# Altium footprint library MyPcbLib.PcbLib: 278 footprints (part 16 of 18)
Each footprint in its own frame and in the unit in brackets; x right, y up, seen from the top. Pads: shape width x height; smd on the part's side, far side on the other; paste and mask are expansions set on the pad; w line width, h text height; cw(c..) or ccw(c..) is an arc to the next point about the centre after c.
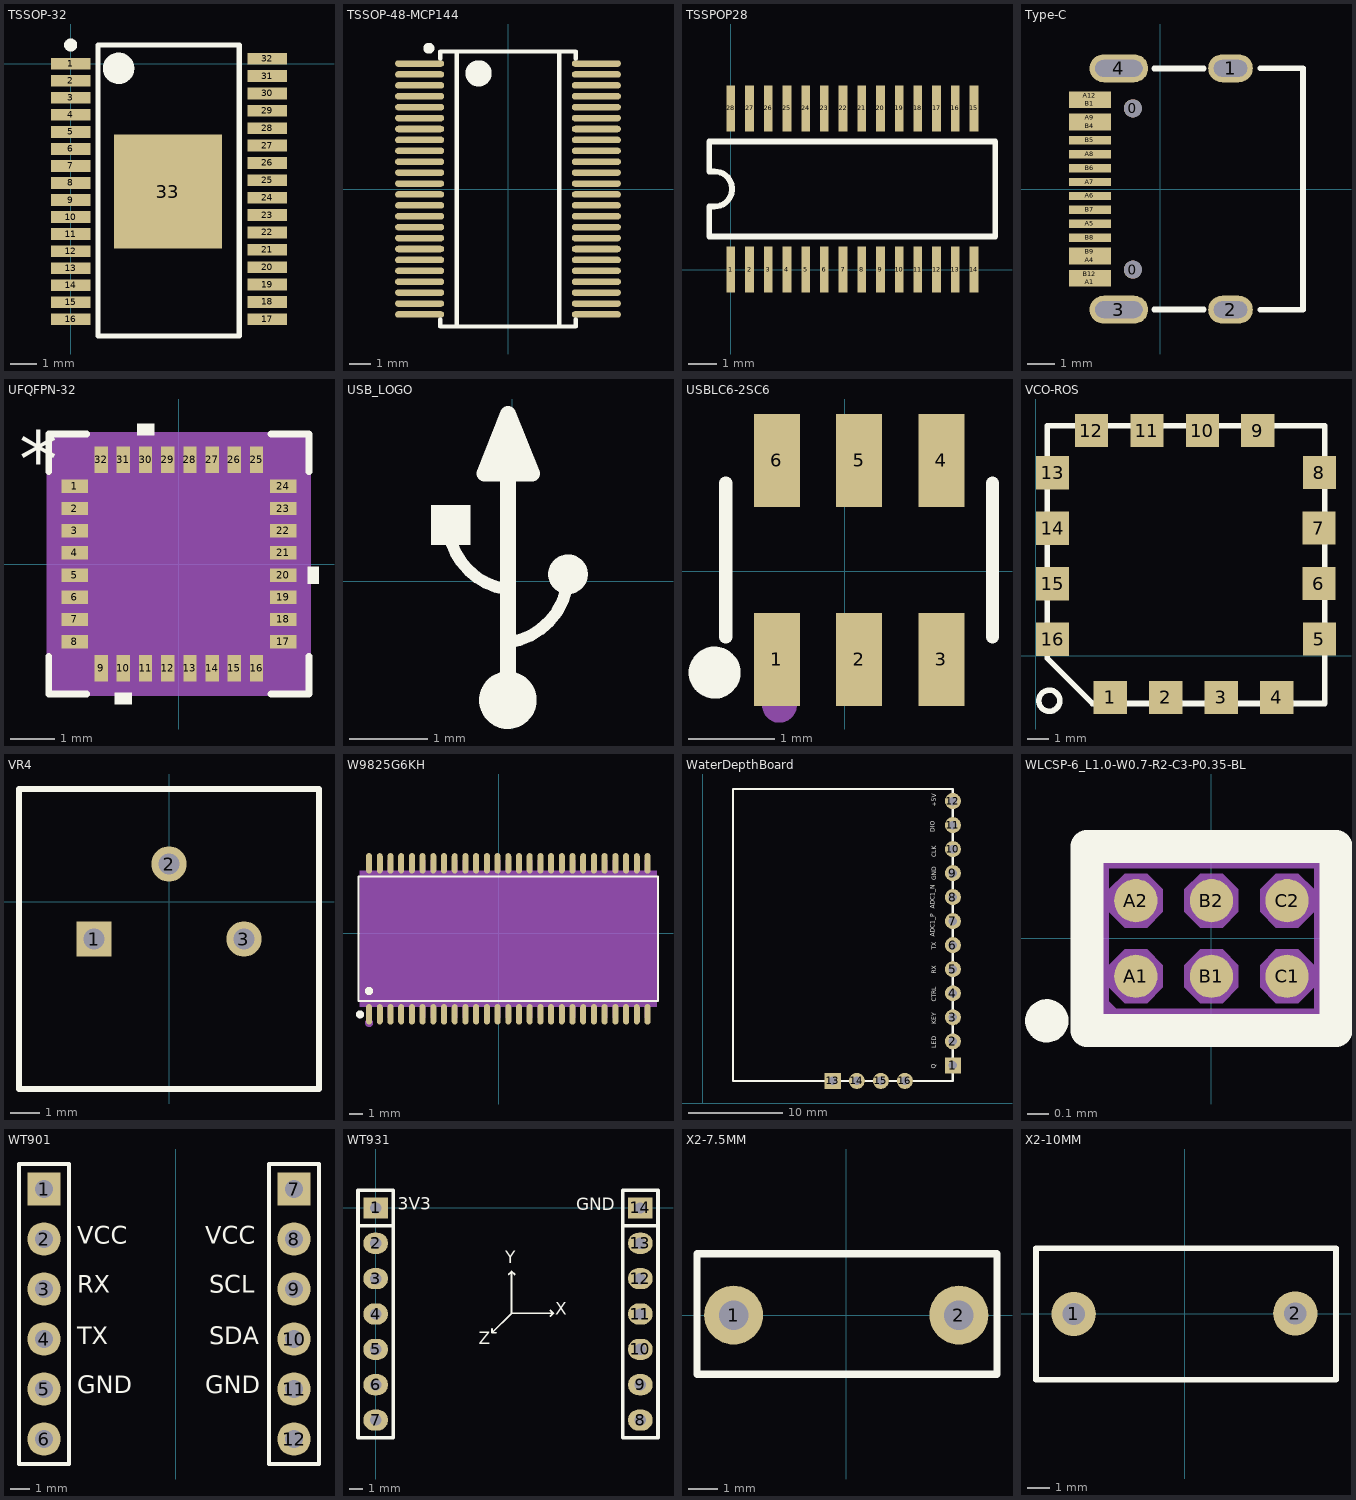
[diagram p15: the footprints below, top view; thin cyan lines are the x and y axes]

## TSSOP-32 [mm]
pads (33):
  rect 1.5x0.45 smd: 1(0,0) 2(0,-0.65) 3(0,-1.3) 4(0,-1.95) 5(0,-2.6) 6(0,-3.25) 7(0,-3.9) 8(0,-4.55) 9(0,-5.2) 10(0,-5.85) 11(0,-6.5) 12(0,-7.15) 13(0,-7.8) 14(0,-8.45) 15(0,-9.1) 16(0,-9.75) 17(7.5,-9.75) 18(7.5,-9.087) 19(7.5,-8.424) 20(7.5,-7.762) 21(7.5,-7.099) 22(7.5,-6.436) 23(7.5,-5.773) 24(7.5,-5.111) 25(7.5,-4.448) 26(7.5,-3.785) 27(7.5,-3.122) 28(7.5,-2.459) 29(7.5,-1.797) 30(7.5,-1.134) 31(7.5,-0.471) 32(7.5,0.192)
  rect 4.11x4.36 smd: 33(3.708,-4.877)
Top Overlay:
  circle w0.25: c0,0.711 r0.125
  circle w0.6: c1.829,-0.178 r0.3
  lines w0.2: 1.041,-10.389 6.426,-10.389 6.426,0.711 1.041,0.711 1.041,-10.389
3D body "User Library-TSSOP-32 11_1x6_2.STEP": height 1.1, standoff 0, extent -0.302,-10.351 7.798,0.749

## TSSOP-48-MCP144 [mm] "TSSOP, 48-Leads, Body 12.5x6.1mm, Pitch 0.5mm, IPC Medium Density"
height 1.2
pads (48):
  oval 2.25x0.3 smd: 1(-4.05,5.75) 2(-4.05,5.25) 3(-4.05,4.75) 4(-4.05,4.25) 5(-4.05,3.75) 6(-4.05,3.25) 7(-4.05,2.75) 8(-4.05,2.25) 9(-4.05,1.75) 10(-4.05,1.25) 11(-4.05,0.75) 12(-4.05,0.25) 13(-4.05,-0.25) 14(-4.05,-0.75) 15(-4.05,-1.25) 16(-4.05,-1.75) 17(-4.05,-2.25) 18(-4.05,-2.75) 19(-4.05,-3.25) 20(-4.05,-3.75) 21(-4.05,-4.25) 22(-4.05,-4.75) 23(-4.05,-5.25) 24(-4.05,-5.75) 25(4.05,-5.75) 26(4.05,-5.25) 27(4.05,-4.75) 28(4.05,-4.25) 29(4.05,-3.75) 30(4.05,-3.25) 31(4.05,-2.75) 32(4.05,-2.25) 33(4.05,-1.75) 34(4.05,-1.25) 35(4.05,-0.75) 36(4.05,-0.25) 37(4.05,0.25) 38(4.05,0.75) 39(4.05,1.25) 40(4.05,1.75) 41(4.05,2.25) 42(4.05,2.75) 43(4.05,3.25) 44(4.05,3.75) 45(4.05,4.25) 46(4.05,4.75) 47(4.05,5.25) 48(4.05,5.75)
Top Overlay:
  circle w0.25: c-3.625,6.45 r0.125
  circle w0.6: c-1.35,5.3 r0.3
  lines w0.2: -3.1,-5.969 -3.1,-6.3 3.1,-6.3 3.1,-5.969 ; -3.1,5.969 -3.1,6.3 3.1,6.3 3.1,5.969 ; -2.35,-6.3 -2.35,6.3 ; 2.35,-6.3 2.35,6.3
3D body "TSSOP-48-MCP144.STEP": height 1.2, standoff 0, extent -4.089,-6.299 4.099,6.301

## TSSPOP28 [mm]
pads (28):
  rect 0.3x1.6 smd: 1(0,0) 2(0.65,0) 3(1.299,0) 4(1.949,0) 5(2.599,0) 6(3.248,0) 7(3.898,0) 8(4.548,0) 9(5.197,0) 10(5.847,0) 11(6.497,0) 12(7.146,0) 13(7.796,0) 14(8.445,0) 15(8.445,5.6) 16(7.796,5.6) 17(7.146,5.6) 18(6.496,5.6) 19(5.847,5.6) 20(5.197,5.6) 21(4.548,5.6) 22(3.898,5.6) 23(3.248,5.6) 24(2.599,5.6) 25(1.949,5.6) 26(1.299,5.6) 27(0.65,5.6) 28(0,5.6)
Top Overlay:
  lines w0.2: -0.749,1.149 -0.749,2.191 -0.566,2.191 ccw(c-0.566,2.801) -0.566,3.41 -0.749,3.41 -0.749,4.451 9.182,4.451 9.182,1.149 -0.749,1.149
3D body "TSSOP28.STEP": height 1.05, standoff 0, extent -0.671,-0.601 9.129,5.999

## Type-C [mm]
pads (22):
  round 0.65 hole 0.65: 0(-0.98,-2.89) 0(-0.98,2.89)
  oval 1.6x1 hole 0.6 slot 1.2 at 0 deg: 1(2.52,4.325) 2(2.52,-4.325)
  oval 2.1x1 hole 0.6 slot 1.7 at 0 deg: 3(-1.48,-4.325) 4(-1.48,4.325)
  rect 1.5x0.3 smd: A1(-2.52,-3.35) A4(-2.52,-2.55) A5(-2.52,-1.25) A6(-2.52,-0.25) A7(-2.52,0.25) A8(-2.52,1.25) A9(-2.52,2.55) A12(-2.52,3.35) B1(-2.52,3.05) B4(-2.52,2.25) B5(-2.52,1.75) B6(-2.52,0.75) B7(-2.52,-0.75) B8(-2.52,-1.75) B9(-2.52,-2.25) B12(-2.52,-3.05)
Top Overlay:
  lines w0.203: -0.218,-4.318 1.56,-4.318 ; -0.218,4.318 1.56,4.318 ; 3.592,-4.325 5.12,-4.325 5.12,4.325 3.592,4.325
3D body "TypeC-SMD16P.STEP": height 3.36, standoff -0.9, extent -2.542,-4.458 5.209,4.492

## UFQFPN-32 [mm]
pads (32):
  rect 0.6x0.3 smd paste-0.15 mask+0: 1(-2.35,1.75) 2(-2.35,1.25) 3(-2.35,0.75) 4(-2.35,0.25) 5(-2.35,-0.25) 6(-2.35,-0.75) 7(-2.35,-1.25) 8(-2.35,-1.75) 17(2.35,-1.75) 18(2.35,-1.25) 19(2.35,-0.75) 20(2.35,-0.25) 21(2.35,0.25) 22(2.35,0.75) 23(2.35,1.25) 24(2.35,1.75)
  rect 0.3x0.6 smd paste-0.15 mask+0: 9(-1.75,-2.35) 10(-1.25,-2.35) 11(-0.75,-2.35) 12(-0.25,-2.35) 13(0.25,-2.35) 14(0.75,-2.35) 15(1.25,-2.35) 16(1.75,-2.35) 25(1.75,2.35) 26(1.25,2.35) 27(0.75,2.35) 28(0.25,2.35) 29(-0.25,2.35) 30(-0.75,2.35) 31(-1.25,2.35) 32(-1.75,2.35)
Top Overlay:
  region: -0.56,2.904 -0.941,2.904 -0.941,3.158 -0.56,3.158
  region: 2.904,-0.059 3.158,-0.059 3.158,-0.44 2.904,-0.44
  region: -1.06,-2.904 -1.441,-2.904 -1.441,-3.158 -1.06,-3.158
  lines w0.152: -2.931,-2.078 -2.931,-2.931 -2.078,-2.931 ; -2.931,2.078 -2.931,2.931 -2.078,2.931 ; 2.078,-2.931 2.931,-2.931 2.931,-2.078 ; 2.078,2.931 2.931,2.931 2.931,2.078
  text "*" at -3.602,1.746 h1.27
Top Paste:
  region: -1.6,2.65 -1.9,2.65 -1.9,2.05 -1.6,2.05
  region: -1.1,2.65 -1.4,2.65 -1.4,2.05 -1.1,2.05
  region: -0.6,2.65 -0.9,2.65 -0.9,2.05 -0.6,2.05
  region: -0.1,2.65 -0.4,2.65 -0.4,2.05 -0.1,2.05
  region: 0.4,2.65 0.1,2.65 0.1,2.05 0.4,2.05
  region: 0.9,2.65 0.6,2.65 0.6,2.05 0.9,2.05
  region: 1.4,2.65 1.1,2.65 1.1,2.05 1.4,2.05
  region: 1.9,2.65 1.6,2.65 1.6,2.05 1.9,2.05
  region: 2.65,1.9 2.05,1.9 2.05,1.6 2.65,1.6
  region: 2.65,1.4 2.05,1.4 2.05,1.1 2.65,1.1
  region: 2.65,0.9 2.05,0.9 2.05,0.6 2.65,0.6
  region: 2.65,0.4 2.05,0.4 2.05,0.1 2.65,0.1
  region: 2.65,-0.1 2.05,-0.1 2.05,-0.4 2.65,-0.4
  region: 2.65,-0.6 2.05,-0.6 2.05,-0.9 2.65,-0.9
  region: 2.65,-1.1 2.05,-1.1 2.05,-1.4 2.65,-1.4
  region: 2.65,-1.6 2.05,-1.6 2.05,-1.9 2.65,-1.9
  region: 1.9,-2.05 1.6,-2.05 1.6,-2.65 1.9,-2.65
  region: 1.4,-2.05 1.1,-2.05 1.1,-2.65 1.4,-2.65
  region: 0.9,-2.05 0.6,-2.05 0.6,-2.65 0.9,-2.65
  region: 0.4,-2.05 0.1,-2.05 0.1,-2.65 0.4,-2.65
  region: -0.1,-2.05 -0.4,-2.05 -0.4,-2.65 -0.1,-2.65
  region: -0.6,-2.05 -0.9,-2.05 -0.9,-2.65 -0.6,-2.65
  region: -1.1,-2.05 -1.4,-2.05 -1.4,-2.65 -1.1,-2.65
  region: -1.6,-2.05 -1.9,-2.05 -1.9,-2.65 -1.6,-2.65
  region: -2.05,-1.6 -2.65,-1.6 -2.65,-1.9 -2.05,-1.9
  region: -2.05,-1.1 -2.65,-1.1 -2.65,-1.4 -2.05,-1.4
  region: -2.05,-0.6 -2.65,-0.6 -2.65,-0.9 -2.05,-0.9
  region: -2.05,-0.1 -2.65,-0.1 -2.65,-0.4 -2.05,-0.4
  region: -2.05,0.4 -2.65,0.4 -2.65,0.1 -2.05,0.1
  region: -2.05,0.9 -2.65,0.9 -2.65,0.6 -2.05,0.6
  region: -2.05,1.4 -2.65,1.4 -2.65,1.1 -2.05,1.1
  region: -2.05,1.9 -2.65,1.9 -2.65,1.6 -2.05,1.6
Top Solder:
  region: -1.6,2.65 -1.9,2.65 -1.9,2.05 -1.6,2.05
  region: -1.1,2.65 -1.4,2.65 -1.4,2.05 -1.1,2.05
  region: -0.6,2.65 -0.9,2.65 -0.9,2.05 -0.6,2.05
  region: -0.1,2.65 -0.4,2.65 -0.4,2.05 -0.1,2.05
  region: 0.4,2.65 0.1,2.65 0.1,2.05 0.4,2.05
  region: 0.9,2.65 0.6,2.65 0.6,2.05 0.9,2.05
  region: 1.4,2.65 1.1,2.65 1.1,2.05 1.4,2.05
  region: 1.9,2.65 1.6,2.65 1.6,2.05 1.9,2.05
  region: 2.65,1.9 2.05,1.9 2.05,1.6 2.65,1.6
  region: 2.65,1.4 2.05,1.4 2.05,1.1 2.65,1.1
  region: 2.65,0.9 2.05,0.9 2.05,0.6 2.65,0.6
  region: 2.65,0.4 2.05,0.4 2.05,0.1 2.65,0.1
  region: 2.65,-0.1 2.05,-0.1 2.05,-0.4 2.65,-0.4
  region: 2.65,-0.6 2.05,-0.6 2.05,-0.9 2.65,-0.9
  region: 2.65,-1.1 2.05,-1.1 2.05,-1.4 2.65,-1.4
  region: 2.65,-1.6 2.05,-1.6 2.05,-1.9 2.65,-1.9
  region: 1.9,-2.05 1.6,-2.05 1.6,-2.65 1.9,-2.65
  region: 1.4,-2.05 1.1,-2.05 1.1,-2.65 1.4,-2.65
  region: 0.9,-2.05 0.6,-2.05 0.6,-2.65 0.9,-2.65
  region: 0.4,-2.05 0.1,-2.05 0.1,-2.65 0.4,-2.65
  region: -0.1,-2.05 -0.4,-2.05 -0.4,-2.65 -0.1,-2.65
  region: -0.6,-2.05 -0.9,-2.05 -0.9,-2.65 -0.6,-2.65
  region: -1.1,-2.05 -1.4,-2.05 -1.4,-2.65 -1.1,-2.65
  region: -1.6,-2.05 -1.9,-2.05 -1.9,-2.65 -1.6,-2.65
  region: -2.05,-1.6 -2.65,-1.6 -2.65,-1.9 -2.05,-1.9
  region: -2.05,-1.1 -2.65,-1.1 -2.65,-1.4 -2.05,-1.4
  region: -2.05,-0.6 -2.65,-0.6 -2.65,-0.9 -2.05,-0.9
  region: -2.05,-0.1 -2.65,-0.1 -2.65,-0.4 -2.05,-0.4
  region: -2.05,0.4 -2.65,0.4 -2.65,0.1 -2.05,0.1
  region: -2.05,0.9 -2.65,0.9 -2.65,0.6 -2.05,0.6
  region: -2.05,1.4 -2.65,1.4 -2.65,1.1 -2.05,1.1
  region: -2.05,1.9 -2.65,1.9 -2.65,1.6 -2.05,1.6
Mechanical 13:
  lines w0.025: -2.55,1.28 -1.28,2.55 ; -2.55,-2.55 -2.55,2.55 2.55,2.55 2.55,-2.55 -2.55,-2.55
  text "*" at -2.114,1.365 h1.27
Mechanical 15:
  region: -2.154,-2.804 -2.804,-2.804 -2.804,-2.154 -2.904,-2.154 -2.904,2.154 -2.804,2.154 -2.804,2.804 -2.154,2.804 -2.154,2.904 2.154,2.904 2.154,2.804 2.804,2.804 2.804,2.154 2.904,2.154 2.904,-2.154 2.804,-2.154 2.804,-2.804 2.154,-2.804 2.154,-2.904 -2.154,-2.904
  lines w0.152: -2.904,-2.154 -2.904,2.154 -2.804,2.154 -2.804,2.804 -2.154,2.804 -2.154,2.904 2.154,2.904 2.154,2.804 2.804,2.804 2.804,2.154 2.904,2.154 2.904,-2.154 2.804,-2.154 2.804,-2.804 2.154,-2.804 2.154,-2.904 -2.154,-2.904 -2.154,-2.804 -2.804,-2.804 -2.804,-2.154 -2.904,-2.154
3D body "UFQFPN-32.step": height 1.4, standoff 0, extent -2.601,-2.601 2.601,2.601

## USB_LOGO [mm]
height 10.16
Top Overlay:
  circle w0.381: c-0.053,-1.518 r0.178
  circle w0.254: c0.716,0.09 r0.127
  rectangle: -1.039,0.463 -0.529,0.973
  lines w0.152: -0.779,0.504 ccw(c0.068,0.774) -0.051,-0.107 ; -0.051,-0.784 ccw(c-0.171,0.097) 0.717,0.046
  lines w0.203: -0.051,-1.384 -0.051,2.139 ; -0.051,1.375 -0.051,2.139 ; -0.051,2.139 -0.351,1.377 0.259,1.377 -0.051,2.139
  lines w0.381: -0.051,1.479 -0.051,1.58

## USBLC6-2SC6 [mm]
pads (6):
  rect 0.532x1.072 smd: 1(-0.783,-1.02) 2(0.167,-1.02) 3(1.117,-1.02) 4(1.117,1.278) 5(0.167,1.278) 6(-0.783,1.278)
Top Overlay:
  circle w0.3: c-1.501,-1.172 r0.15
  lines w0.152: -1.372,-0.76 -1.372,1.018 ; 1.707,-0.76 1.707,1.018
Mechanical 15:
  circle w0.2: c-0.753,-1.551 r0.1

## VCO-ROS [mm] "ROS-425-319"
height 5.33
pads (16):
  rect 1.52x1.52 smd: 1(3.404,-1.905) 2(5.944,-1.905) 3(8.484,-1.905) 4(11.024,-1.905) 5(12.979,0.768) 6(12.954,3.308) 7(12.954,5.848) 8(12.979,8.388) 9(10.16,10.312) 10(7.62,10.312) 11(5.08,10.312) 12(2.54,10.312) 13(0.762,8.382) 14(0.762,5.842) 15(0.762,3.302) 16(0.762,0.762)
Top Overlay:
  circle w0.254: c0.61,-2.057 r0.483
  lines w0.254: 0.508,-0.108 2.584,-2.184 13.233,-2.184 13.233,10.541 0.508,10.541 0.508,-0.108
3D body "ROS-425-319 in CK605 case detailed.step": height 4.57, standoff 0, extent 0.508,-2.184 13.208,10.516

## VR4 [mm] "Feed-Through Capacitor; 3 Leads"
pads (3):
  rect 1.2x1.2 hole 0.7: 1(-2.54,-1.27)
  round 1.2 hole 0.7: 2(0,1.27) 3(2.54,-1.27)
Top Overlay:
  lines w0.2: -5.08,-6.35 -5.08,3.81 2.54,3.81 5.08,3.81 5.08,-6.35 -5.08,-6.35
3D body "vr4.STEP": height 6, standoff 0, extent -5.022,-6.321 4.978,3.679

## W9825G6KH [mil]
pads (54):
  oval 17.64x60 smd: 1(-381.05,-238.98) 2(-349.55,-238.98) 3(-318.06,-238.98) 4(-286.56,-238.98) 5(-255.06,-238.98) 6(-223.57,-238.98) 7(-192.07,-238.98) 8(-160.57,-238.98) 9(-129.08,-238.98) 10(-97.58,-238.98) 11(-66.09,-238.98) 12(-34.59,-238.98) 13(-3.09,-238.98) 14(28.4,-238.98) 15(59.9,-238.98) 16(91.39,-238.98) 17(122.89,-238.98) 18(154.39,-238.98) 19(185.88,-238.98) 20(217.38,-238.98) 21(248.87,-238.98) 22(280.37,-238.98) 23(311.87,-238.98) 24(343.36,-238.98) 25(374.86,-238.98) 26(406.36,-238.98) 27(437.85,-238.98) 28(437.85,205.28) 29(406.36,205.28) 30(374.86,205.28) 31(343.36,205.28) 32(311.87,205.28) 33(280.37,205.28) 34(248.87,205.28) 35(217.38,205.28) 36(185.88,205.28) 37(154.39,205.28) 38(122.89,205.28) 39(91.39,205.28) 40(59.9,205.28) 41(28.4,205.28) 42(-3.09,205.28) 43(-34.59,205.28) 44(-66.09,205.28) 45(-97.58,205.28) 46(-129.08,205.28) 47(-160.57,205.28) 48(-192.07,205.28) 49(-223.57,205.28) 50(-255.06,205.28) 51(-286.56,205.28) 52(-318.06,205.28) 53(-349.55,205.28) 54(-381.05,205.28)
Top Overlay:
  circle w11.81: c-407.68,-238.98 r5.91
  circle w11.81: c-381.05,-170.35 r5.91
  lines w6: -412,-199.98 468.8,-199.98 468.8,166.28 -412,166.28 -412,-199.98
Mechanical 4:
  region: -409,-216.85 -409,183.15 465.8,183.15 465.8,-216.85
Mechanical 5:
  drawing of 108 lines, arcs and shapes, not listed
Mechanical 6:
  circle w2.36: c-409,-248.35 r1.18
Mechanical 15:
  circle w11.81: c-381.05,-264.09 r5.91

## WaterDepthBoard [mm]
pads (16):
  rect 1.7x1.7 hole 0.9: 1(26.468,3.99) 13(13.768,2.339)
  round 1.7 hole 0.9: 2(26.468,6.53) 3(26.468,9.07) 4(26.468,11.61) 5(26.468,14.15) 6(26.468,16.69) 7(26.468,19.23) 8(26.468,21.77) 9(26.468,24.31) 10(26.468,26.85) 11(26.468,29.39) 12(26.468,31.93) 14(16.308,2.339) 15(18.848,2.339) 16(21.388,2.339)
Top Overlay:
  lines w0.254: 3.227,2.339 26.468,2.339 26.468,13.642 26.468,33.2 3.227,33.2 3.227,13.642 3.227,2.339
  text "+5V" at 24.846,31.311 h0.76
  text "DIO" at 24.719,28.644 h0.76
  text "CLK" at 24.846,25.977 h0.76
  text "GND" at 24.846,23.564 h0.76
  text "ADC1_N" at 24.719,20.516 h0.76
  text "ADC1_P" at 24.719,17.595 h0.76
  text "TX" at 24.854,16.198 h0.76
  text "RX" at 24.854,13.658 h0.76
  text "CTRL" at 24.846,10.737 h0.76
  text "KEY" at 24.854,8.324 h0.76
  text "LED" at 24.854,5.784 h0.76
  text "Q" at 24.816,3.625 h0.76

## WLCSP-6_L1.0-W0.7-R2-C3-P0.35-BL [mm]
pads (6):
  round 0.2 smd paste-100 mask+0.051: A1(-0.35,-0.175) A2(-0.35,0.175) B1(0,-0.175) B2(0,0.175) C1(0.35,-0.175) C2(0.35,0.175)
Top Overlay:
  circle w0.1: c-0.762,-0.381 r0.05
  lines w0.152: -0.576,-0.426 -0.576,0.426 0.576,0.426 0.576,-0.426 -0.576,-0.426
Top Paste:
  region: 0.27,0.275 0.43,0.275 0.45,0.255 0.45,0.095 0.43,0.075 0.27,0.075 0.25,0.095 0.25,0.255
  region: 0.27,-0.075 0.43,-0.075 0.45,-0.095 0.45,-0.255 0.43,-0.275 0.27,-0.275 0.25,-0.255 0.25,-0.095
  region: -0.08,0.275 0.08,0.275 0.1,0.255 0.1,0.095 0.08,0.075 -0.08,0.075 -0.1,0.095 -0.1,0.255
  region: -0.08,-0.075 0.08,-0.075 0.1,-0.095 0.1,-0.255 0.08,-0.275 -0.08,-0.275 -0.1,-0.255 -0.1,-0.095
  region: -0.43,0.275 -0.27,0.275 -0.25,0.255 -0.25,0.095 -0.27,0.075 -0.43,0.075 -0.45,0.095 -0.45,0.255
  region: -0.43,-0.075 -0.27,-0.075 -0.25,-0.095 -0.25,-0.255 -0.27,-0.275 -0.43,-0.275 -0.45,-0.255 -0.45,-0.095
Mechanical 15:
  region: 0.475,0.175 0.475,0.227 0.402,0.3 0.298,0.3 0.225,0.227 0.225,0.175 0.225,0.123 0.298,0.05 0.402,0.05 0.475,0.123 0.475,0.175
  region: 0.475,-0.175 0.475,-0.123 0.402,-0.05 0.298,-0.05 0.225,-0.123 0.225,-0.175 0.225,-0.227 0.298,-0.3 0.402,-0.3 0.475,-0.227 0.475,-0.175
  region: 0.125,0.175 0.125,0.227 0.052,0.3 -0.052,0.3 -0.125,0.227 -0.125,0.175 -0.125,0.123 -0.052,0.05 0.052,0.05 0.125,0.123 0.125,0.175
  region: 0.125,-0.175 0.125,-0.123 0.052,-0.05 -0.052,-0.05 -0.125,-0.123 -0.125,-0.175 -0.125,-0.227 -0.052,-0.3 0.052,-0.3 0.125,-0.227 0.125,-0.175
  region: -0.225,0.175 -0.225,0.227 -0.298,0.3 -0.402,0.3 -0.475,0.227 -0.475,0.175 -0.475,0.123 -0.402,0.05 -0.298,0.05 -0.225,0.123 -0.225,0.175
  region: -0.225,-0.175 -0.225,-0.123 -0.298,-0.05 -0.402,-0.05 -0.475,-0.123 -0.475,-0.175 -0.475,-0.227 -0.402,-0.3 -0.298,-0.3 -0.225,-0.227 -0.225,-0.175
  region: -0.44,-0.35 -0.44,-0.325 -0.475,-0.29 -0.525,-0.29 -0.56,-0.325 -0.56,-0.35 -0.56,-0.375 -0.525,-0.41 -0.475,-0.41 -0.44,-0.375 -0.44,-0.35
  lines w0.051: -0.5,-0.35 -0.5,0.35 0.5,0.35 0.5,-0.35 -0.5,-0.35

## WT901 [mm] "维特智能九轴模块"
pads (12):
  rect 1.7x1.7 hole 0.9: 1(-6.7,-8.2) 7(6,-8.2)
  round 1.7 hole 0.9: 2(-6.7,-10.74) 3(-6.7,-13.28) 4(-6.7,-15.82) 5(-6.7,-18.36) 6(-6.7,-20.9) 8(6,-10.74) 9(6,-13.28) 10(6,-15.82) 11(6,-18.36) 12(6,-20.9)
Top Overlay:
  lines w0.2: -7.97,-22.17 -5.43,-22.17 -5.43,-6.93 -7.97,-6.93 -7.97,-22.17 ; 4.73,-22.17 7.27,-22.17 7.27,-6.93 4.73,-6.93 4.73,-22.17
  text "TX" at -5,-16.383 h1.52
  text "RX" at -5,-13.783 h1.52
  text "SCL" at 1.699,-13.783 h1.52
  text "SDA" at 1.697,-16.383 h1.52
  text "GND" at 1.499,-18.883 h1.52
  text "GND" at -5,-18.883 h1.52
  text "VCC" at 1.5,-11.283 h1.52
  text "VCC" at -4.999,-11.283 h1.52
3D body "HDR2.54-1P_M.STEP": height 8.5, standoff -3, extent 4.73,-14.55 7.27,-12.01
3D body "HDR2.54-1P_M.STEP": height 8.5, standoff -3, extent 4.73,-9.47 7.27,-6.93
3D body "HDR2.54-1P_M.STEP": height 8.5, standoff -3, extent 4.73,-12.01 7.27,-9.47
3D body "HDR2.54-1P_M.STEP": height 8.5, standoff -3, extent 4.73,-22.17 7.27,-19.63
3D body "HDR2.54-1P_M.STEP": height 8.5, standoff -3, extent 4.73,-17.09 7.27,-14.55
3D body "HDR2.54-1P_M.STEP": height 8.5, standoff -3, extent 4.73,-19.63 7.27,-17.09
3D body "HDR2.54-1P_M.STEP": height 8.5, standoff -3, extent -7.97,-14.55 -5.43,-12.01
3D body "HDR2.54-1P_M.STEP": height 8.5, standoff -3, extent -7.97,-9.47 -5.43,-6.93
3D body "HDR2.54-1P_M.STEP": height 8.5, standoff -3, extent -7.97,-12.01 -5.43,-9.47
3D body "HDR2.54-1P_M.STEP": height 8.5, standoff -3, extent -7.97,-22.17 -5.43,-19.63
3D body "HDR2.54-1P_M.STEP": height 8.5, standoff -3, extent -7.97,-17.09 -5.43,-14.55
3D body "HDR2.54-1P_M.STEP": height 8.5, standoff -3, extent -7.97,-19.63 -5.43,-17.09

## WT931 [mil]
pads (14):
  rect 70x60 hole 32: 1(0,0) 14(748.4,0)
  oval 70x60 hole 32: 2(0,-100) 3(0,-200) 4(0,-300) 5(0,-400) 6(0,-500) 7(0,-600) 8(748.4,-600) 9(748.4,-500) 10(748.4,-400) 11(748.4,-300) 12(748.4,-200) 13(748.4,-100)
Top Overlay:
  lines w5: 329.02,-341.41 329.02,-353.22 ; 340.83,-353.22 329.02,-353.22 ; 376.07,-188.06 384.42,-179.71 ; 384.7,-297.54 329.02,-353.22 ; 392.77,-188.06 384.42,-179.71 ; 494.18,-306.17 502.53,-297.82 ; 494.18,-289.47 502.53,-297.82 ; 384.42,-179.71 384.42,-297.82 502.53,-297.82
  lines w10: -50,-50 50,-50 ; 698.4,-50 798.4,-50 ; -50,-650 -50,50 50,50 50,-650 -50,-650 ; 698.4,-650 698.4,50 798.4,50 798.4,-650 698.4,-650
  text "GND" at 566.93,-19.02 h60
  text "3V3" at 62.99,-18.35 h60
  text "X" at 507.87,-314.96 h60
  text "Y" at 366.2,-169.29 h60
  text "Z" at 291.34,-397.64 h60
3D body "Female-Header-2.54-Single-7.stp": height 125.98, standoff -334.65, extent 699.2,-654.92 797.62,54.92
3D body "Female-Header-2.54-Single-7.stp": height 125.98, standoff -334.65, extent -49.21,-654.92 49.22,54.92

## X2-7.5MM [mm]
pads (2):
  round 2 hole 1: 1(-3.823,0) 2(3.823,0)
Top Overlay:
  lines w0.254: -5.067,-2.007 5.118,-2.007 5.118,2.083 -5.067,2.083 -5.067,-2.007
3D body "10MM_X2_cap.step": height 9.5, standoff -3, extent -4.966,-1.956 5.034,2.044

## X2-10MM [mm] "18.25MM*11.4MM*5.78MM0.1UF 脚距15MM"
pads (2):
  round 2 hole 1: 1(-5,-0.013) 2(5,0.013)
Top Overlay:
  lines w0.254: -6.702,-2.984 6.836,-2.984 6.836,2.959 -6.702,2.959 -6.702,-2.984
3D body "X2-10MM.step": height 12, standoff -2.81, extent -6.5,-2.489 6.5,2.512